# Altium footprint library Dip Switches.PcbLib: 39 footprints (part 1 of 3)
Each footprint in its own frame and in the unit in brackets; x right, y up, seen from the top. Pads: shape width x height; smd on the part's side, far side on the other; paste and mask are expansions set on the pad; w line width, h text height; cw(c..) or ccw(c..) is an arc to the next point about the centre after c.
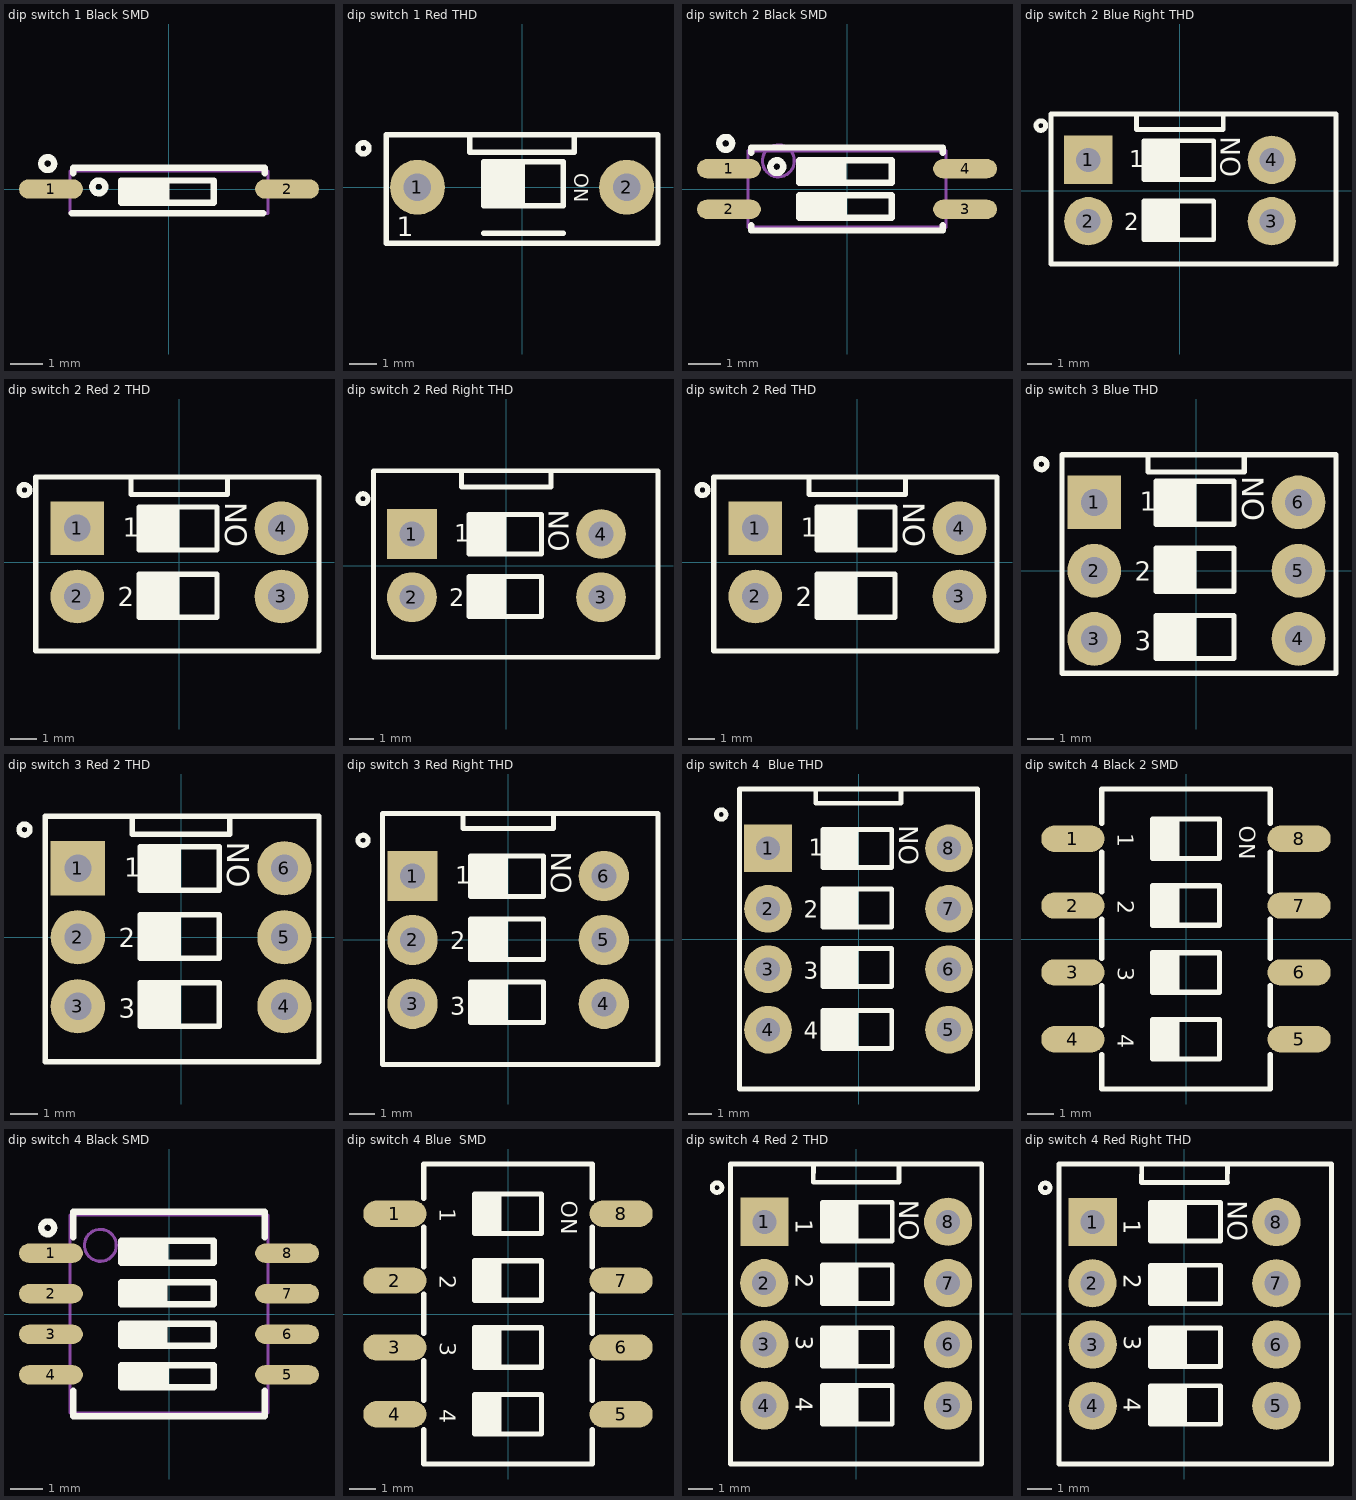
[diagram p0: the footprints below, top view; thin cyan lines are the x and y axes]

## dip switch 1 Black SMD [mm] "SWITCH DIP 12POS, THD, 2.54mm"
pads (2):
  oval 2x0.6 smd: 1(-3.7,0) 2(3.7,0)
Top Overlay:
  circle w0.2: c-3.8,0.795 r0.2
  circle w0.2: c-2.2,0.065 r0.2
  rectangle: -1.482,-0.358 0.018,0.242
  lines w0.2: -3.048,-0.762 2.952,-0.762 ; -3,0.495 -3,0.665 3,0.665 3,0.495 ; -1.5,-0.435 1.4,-0.435 1.4,0.265 -1.5,0.265 -1.5,-0.435
Mechanical 13:
  lines w0.1: -3.1,-0.762 3.1,-0.762 3.1,0.565 -3.1,0.565 -3.1,-0.762
3D body "User Library-SMD DIP Switch 1x.step": height 4.15, standoff 0, extent -4.95,-2.005 4.95,2.005

## dip switch 1 Red THD [mm] "SWITCH DIP 12POS, THD, 2.54mm"
pads (2):
  round 2 hole 1: 1(-3.81,0) 2(3.81,0)
Top Overlay:
  circle w0.2: c-5.776,1.42 r0.2
  rectangle: -1.4,-0.67 0.1,0.93
  lines w0.2: -1.91,1.778 -1.91,1.27 1.9,1.27 1.9,1.905 ; -1.4,-1.67 1.5,-1.67 ; -4.953,-2.032 4.953,-2.032 4.953,1.905 -4.953,1.905 -4.953,-2.032 ; -1.4,-0.67 -1.4,0.93 1.5,0.93 1.5,-0.67 -1.4,-0.67
  text "ON" at 1.905,0.508 h0.51
  text "1" at -4.572,-1.778 h0.7
3D body "User Library-DIP_1 (2).step": height 6.82, standoff -3.65, extent -5,-2.095 5,1.905

## dip switch 2 Black SMD [mm] "SWITCH DIP 2POS, SMD, 1.27mm, 6.1X2.4mm"
height 2.3
pads (4):
  oval 2x0.6 smd: 1(-3.7,0.635) 2(-3.7,-0.635) 3(3.7,-0.635) 4(3.7,0.635)
Top Overlay:
  circle w0.2: c-2.2,0.7 r0.2
  circle w0.2: c-3.8,1.43 r0.2
  rectangle: -1.509,0.238 -0.009,0.838
  rectangle: -1.498,-0.842 0.002,-0.242
  lines w0.2: -3,-1.13 -3,-1.3 3,-1.3 3,-1.13 ; -3,1.13 -3,1.3 3,1.3 3,1.13 ; -1.5,-0.9 1.4,-0.9 1.4,-0.2 -1.5,-0.2 -1.5,-0.9 ; -1.5,0.2 -1.5,0.9 1.4,0.9 1.4,0.2 -1.5,0.2
Mechanical 13:
  circle w0.1: c-2.15,0.88 r0.5
  lines w0.1: -3.1,-1.2 -3.1,1.2 3.1,1.2 3.1,-1.2 -3.1,-1.2
3D body "218-2polesLP.STP": height 2.57, standoff -0.05, extent -4.22,-1.855 4.22,1.855

## dip switch 2 Blue Right THD [mm]
height 6.5
pads (4):
  rect 2x2 hole 1 mask+0.1: 1(-3.8,1.27)
  round 2 hole 1 mask+0.1: 2(-3.8,-1.27) 3(3.8,-1.27) 4(3.8,1.27)
Top Overlay:
  circle w0.2: c-5.766,2.69 r0.2
  rectangle: -1.5,-2.04 0,-0.44
  rectangle: -1.5,0.46 0,2.06
  lines w0.2: -1.8,3.125 -1.8,2.525 1.79,2.525 1.79,3.125 ; -5.345,-3.048 6.464,-3.048 6.464,3.175 -5.345,3.175 -5.345,-3.048 ; -1.5,-2.04 1.4,-2.04 1.4,-0.44 -1.5,-0.44 -1.5,-2.04 ; -1.5,0.46 -1.5,2.06 1.4,2.06 1.4,0.46 -1.5,0.46
  text "2" at -2.3,-1.64 h0.7
  text "1" at -2.1,0.96 h0.7
  text "ON" at 2.5,0.56 h0.8
3D body "User Library-Switch-Piano-DIP-2.step": height 12.46, standoff -3.64, extent -5.244,-3 9.868,3

## dip switch 2 Red 2 THD [mm]
height 6.5
pads (4):
  rect 2x2 hole 1 mask+0.1: 1(-3.8,1.27)
  round 2 hole 1 mask+0.1: 2(-3.8,-1.27) 3(3.8,-1.27) 4(3.8,1.27)
Top Overlay:
  circle w0.2: c-5.766,2.69 r0.2
  rectangle: -1.5,0.46 0,2.06
  rectangle: -1.5,-2.04 0,-0.44
  lines w0.2: -1.8,3.125 -1.8,2.525 1.79,2.525 1.79,3.125 ; -5.345,-3.301 -5.345,3.175 5.196,3.175 5.196,-3.301 -5.345,-3.301 ; -1.5,-2.04 -1.5,-0.44 1.4,-0.44 1.4,-2.04 -1.5,-2.04 ; -1.5,0.46 1.4,0.46 1.4,2.06 -1.5,2.06 -1.5,0.46
  text "ON" at 2.5,0.56 h0.8
  text "1" at -2.1,0.96 h0.7
  text "2" at -2.3,-1.64 h0.7
3D body "User Library-DS1040-02 (DIP_switch).step": height 6.8, standoff -3.85, extent -4.94,-3.34 4.96,3.2

## dip switch 2 Red Right THD [mm]
height 6.5
pads (4):
  rect 2x2 hole 1 mask+0.1: 1(-3.8,1.27)
  round 2 hole 1 mask+0.1: 2(-3.8,-1.27) 3(3.8,-1.27) 4(3.8,1.27)
Top Overlay:
  circle w0.2: c-5.766,2.69 r0.2
  rectangle: -1.5,-2.04 0,-0.44
  rectangle: -1.5,0.46 0,2.06
  lines w0.2: -1.8,3.76 -1.8,3.16 1.79,3.16 1.79,3.76 ; -5.345,-3.681 6.087,-3.681 6.087,3.812 -5.345,3.812 -5.345,-3.681 ; -1.5,-2.04 1.4,-2.04 1.4,-0.44 -1.5,-0.44 -1.5,-2.04 ; -1.5,0.46 -1.5,2.06 1.4,2.06 1.4,0.46 -1.5,0.46
  text "2" at -2.3,-1.64 h0.7
  text "1" at -2.1,0.96 h0.7
  text "ON" at 2.5,0.56 h0.8
3D body "User Library-DIP SW 2P TH RA.step": height 7.9, standoff -3.8, extent -4.961,-3.575 5.959,3.685

## dip switch 2 Red THD [mm]
height 6.5
pads (4):
  rect 2x2 hole 1 mask+0.1: 1(-3.8,1.27)
  round 2 hole 1 mask+0.1: 2(-3.8,-1.27) 3(3.8,-1.27) 4(3.8,1.27)
Top Overlay:
  circle w0.2: c-5.766,2.69 r0.2
  rectangle: -1.5,0.46 0,2.06
  rectangle: -1.5,-2.04 0,-0.44
  lines w0.2: -1.8,3.125 -1.8,2.525 1.79,2.525 1.79,3.125 ; -5.345,-3.301 -5.345,3.175 5.196,3.175 5.196,-3.301 -5.345,-3.301 ; -1.5,-2.04 -1.5,-0.44 1.4,-0.44 1.4,-2.04 -1.5,-2.04 ; -1.5,0.46 1.4,0.46 1.4,2.06 -1.5,2.06 -1.5,0.46
  text "ON" at 2.5,0.56 h0.8
  text "1" at -2.1,0.96 h0.7
  text "2" at -2.3,-1.64 h0.7
3D body "dip2.STEP": height 6.91, standoff -1.79, extent -5.041,-3.249 4.959,3.251

## dip switch 3 Blue THD [mm]
height 6.5
pads (6):
  rect 2x2 hole 1 mask+0.1: 1(-3.8,2.54)
  round 2 hole 1 mask+0.1: 2(-3.8,0) 3(-3.8,-2.54) 4(3.8,-2.54) 5(3.8,0) 6(3.8,2.54)
Top Overlay:
  circle w0.2: c-5.766,3.96 r0.2
  rectangle: -1.5,1.73 0,3.33
  rectangle: -1.5,-0.77 0,0.83
  rectangle: -1.5,-3.27 0,-1.67
  lines w0.2: -1.8,4.268 -1.8,3.668 1.79,3.668 1.79,4.268 ; -5,-3.818 -5,4.31 5.197,4.31 5.197,-3.818 -5,-3.818 ; -1.5,-3.27 -1.5,-1.67 1.4,-1.67 1.4,-3.27 -1.5,-3.27 ; -1.5,-0.77 -1.5,0.83 1.4,0.83 1.4,-0.77 -1.5,-0.77 ; -1.5,1.73 1.4,1.73 1.4,3.33 -1.5,3.33 -1.5,1.73
  text "ON" at 2.5,1.83 h0.8
  text "1" at -2.1,2.23 h0.7
  text "2" at -2.3,-0.37 h0.7
  text "3" at -2.3,-2.97 h0.7
3D body "User Library-switch 3.step": height 7, standoff -3.7, extent -4.957,-3.82 4.943,4.314

## dip switch 3 Red 2 THD [mm]
height 6.5
pads (6):
  rect 2x2 hole 1 mask+0.1: 1(-3.8,2.54)
  round 2 hole 1 mask+0.1: 2(-3.8,0) 3(-3.8,-2.54) 4(3.8,-2.54) 5(3.8,0) 6(3.8,2.54)
Top Overlay:
  circle w0.2: c-5.766,3.96 r0.2
  rectangle: -1.5,1.73 0,3.33
  rectangle: -1.5,-0.77 0,0.83
  rectangle: -1.5,-3.27 0,-1.67
  lines w0.2: -1.8,4.395 -1.8,3.795 1.79,3.795 1.79,4.395 ; -5,-4.573 -5,4.444 5.07,4.444 5.07,-4.573 -5,-4.573 ; -1.5,-3.27 -1.5,-1.67 1.4,-1.67 1.4,-3.27 -1.5,-3.27 ; -1.5,-0.77 -1.5,0.83 1.4,0.83 1.4,-0.77 -1.5,-0.77 ; -1.5,1.73 1.4,1.73 1.4,3.33 -1.5,3.33 -1.5,1.73
  text "ON" at 2.5,1.83 h0.8
  text "1" at -2.1,2.23 h0.7
  text "2" at -2.3,-0.37 h0.7
  text "3" at -2.3,-2.97 h0.7
3D body "User Library-DS1040-03 (DIP_switch).step": height 6.8, standoff -3.85, extent -4.959,-4.541 4.941,4.539

## dip switch 3 Red Right THD [mm]
height 6.5
pads (6):
  rect 2x2 hole 1 mask+0.1: 1(-3.8,2.54)
  round 2 hole 1 mask+0.1: 2(-3.8,0) 3(-3.8,-2.54) 4(3.8,-2.54) 5(3.8,0) 6(3.8,2.54)
Top Overlay:
  circle w0.2: c-5.766,3.96 r0.2
  rectangle: -1.5,-3.27 0,-1.67
  rectangle: -1.5,-0.77 0,0.83
  rectangle: -1.5,1.73 0,3.33
  lines w0.2: -1.8,5.03 -1.8,4.43 1.79,4.43 1.79,5.03 ; -5,-4.953 5.949,-4.953 5.949,5.03 -5,5.03 -5,-4.953 ; -1.5,-3.27 1.4,-3.27 1.4,-1.67 -1.5,-1.67 -1.5,-3.27 ; -1.5,-0.77 1.4,-0.77 1.4,0.83 -1.5,0.83 -1.5,-0.77 ; -1.5,1.73 -1.5,3.33 1.4,3.33 1.4,1.73 -1.5,1.73
  text "3" at -2.3,-2.97 h0.7
  text "2" at -2.3,-0.37 h0.7
  text "1" at -2.1,2.23 h0.7
  text "ON" at 2.5,1.83 h0.8
3D body "User Library-DIP SW 3P TH RA (1).step": height 7.9, standoff -3.8, extent -4.91,-4.901 6.011,4.899

## dip switch 4  Blue THD [mm] "SWITCH DIP 4POS, THD, 2.54mm, YL04"
height 6.5
pads (8):
  rect 2x2 hole 1 mask+0.1: 1(-3.8,3.81)
  round 2 hole 1 mask+0.1: 2(-3.8,1.27) 3(-3.8,-1.27) 4(-3.8,-3.81) 5(3.8,-3.81) 6(3.8,-1.27) 7(3.8,1.27) 8(3.8,3.81)
Top Overlay:
  circle w0.2: c-5.766,5.23 r0.2
  rectangle: -1.5,3 0,4.6
  rectangle: -1.5,0.5 0,2.1
  rectangle: -1.5,-2 0,-0.4
  rectangle: -1.5,-4.6 0,-3
  lines w0.2: -1.8,6.3 -1.8,5.7 1.79,5.7 1.79,6.3 ; -5,-6.3 -5,6.3 5,6.3 5,-6.3 -5,-6.3 ; -1.5,-4.6 -1.5,-3 1.4,-3 1.4,-4.6 -1.5,-4.6 ; -1.5,-2 -1.5,-0.4 1.4,-0.4 1.4,-2 -1.5,-2 ; -1.5,0.5 -1.5,2.1 1.4,2.1 1.4,0.5 -1.5,0.5 ; -1.5,3 1.4,3 1.4,4.6 -1.5,4.6 -1.5,3
  text "ON" at 2.5,3.1 h0.8
  text "1" at -2.1,3.5 h0.7
  text "2" at -2.3,0.9 h0.7
  text "3" at -2.3,-1.7 h0.7
  text "4" at -2.3,-4.2 h0.7
3D body "User Library-DIP SWITCH 4 POS CTS 206.step": height 8.14, standoff -3.5, extent -4.89,-6.17 4.89,6.17

## dip switch 4 Black 2 SMD [mm] "SWITCH DIP 4POS, SMD, 2.54mm, CTS-219-04"
pads (8):
  oval 2.4x1 smd: 1(-4.3,3.81) 2(-4.3,1.27) 3(-4.3,-1.27) 4(-4.3,-3.81) 5(4.3,-3.81) 6(4.3,-1.27) 7(4.3,1.27) 8(4.3,3.81)
Top Overlay:
  region: -1.27,4.56 -1.27,3.06 -0.254,3.06 -0.254,4.56
  region: -1.27,2.02 -1.27,0.52 -0.254,0.52 -0.254,2.02
  region: -1.27,-0.52 -1.27,-2.02 -0.254,-2.02 -0.254,-0.52
  region: -1.27,-3.06 -1.27,-4.56 -0.254,-4.56 -0.254,-3.06
  lines w0.2: -3.2,-4.4 -3.2,-5.7 3.2,-5.7 3.2,-4.4 ; -3.2,-3.28 -3.2,-1.78 ; -3.2,-0.74 -3.2,0.76 ; -3.2,1.8 -3.2,3.3 ; -3.2,4.4 -3.2,5.7 3.2,5.7 3.2,4.4 ; 3.2,-3.28 3.2,-1.78 ; 3.2,-0.74 3.2,0.76 ; 3.2,1.8 3.2,3.3 ; -1.27,-4.56 -1.27,-3.06 1.27,-3.06 1.27,-4.56 -1.27,-4.56 ; -1.27,-2.02 -1.27,-0.52 1.27,-0.52 1.27,-2.02 -1.27,-2.02 ; -1.27,0.52 -1.27,2.02 1.27,2.02 1.27,0.52 -1.27,0.52 ; -1.27,3.06 -1.27,4.56 1.27,4.56 1.27,3.06 -1.27,3.06
  text "ON" at 2.021,4.31 h0.61
  text "1" at -2.596,4.01 h0.61
  text "2" at -2.596,1.47 h0.61
  text "3" at -2.596,-1.07 h0.61
  text "4" at -2.596,-3.61 h0.61
3D body "User Library-DM04V.step": height 4.52, standoff 0, extent -4.89,-5.55 4.89,5.55

## dip switch 4 Black SMD [mm] "SWITCH DIP 4POS, SMD, 1.27mm, 6.1X6.2mm , TDA series"
height 2.3
pads (8):
  oval 2x0.6 smd: 1(-3.7,1.905) 2(-3.7,0.635) 3(-3.7,-0.635) 4(-3.7,-1.905) 5(3.7,-1.905) 6(3.7,-0.635) 7(3.7,0.635) 8(3.7,1.905)
Top Overlay:
  circle w0.2: c-3.8,2.7 r0.2
  rectangle: -1.504,-2.246 -0.004,-1.646
  rectangle: -1.544,-0.943 -0.044,-0.343
  rectangle: -1.544,0.368 -0.044,0.968
  rectangle: -1.517,1.621 -0.017,2.221
  lines w0.2: -3,-2.4 -3,-3.2 3,-3.2 3,-2.4 ; -3,2.4 -3,3.2 3,3.2 3,2.4 ; -1.5,-2.3 -1.5,-1.6 1.4,-1.6 1.4,-2.3 -1.5,-2.3 ; -1.5,-1 -1.5,-0.3 1.4,-0.3 1.4,-1 -1.5,-1 ; -1.5,0.3 -1.5,1 1.4,1 1.4,0.3 -1.5,0.3 ; -1.5,1.6 -1.5,2.3 1.4,2.3 1.4,1.6 -1.5,1.6
Mechanical 13:
  circle w0.1: c-2.15,2.15 r0.5
  lines w0.1: -3.1,-3.1 -3.1,3.1 3.1,3.1 3.1,-3.1 -3.1,-3.1
3D body "218-4polesLP.STP": height 2.57, standoff -0.05, extent -4.22,-3.125 4.22,3.125

## dip switch 4 Blue  SMD [mm] "SWITCH DIP 4POS, SMD, 2.54mm, CTS-219-04"
pads (8):
  oval 2.4x1 smd: 1(-4.3,3.81) 2(-4.3,1.27) 3(-4.3,-1.27) 4(-4.3,-3.81) 5(4.3,-3.81) 6(4.3,-1.27) 7(4.3,1.27) 8(4.3,3.81)
Top Overlay:
  region: -1.27,-3.06 -1.27,-4.56 -0.254,-4.56 -0.254,-3.06
  region: -1.27,-0.52 -1.27,-2.02 -0.254,-2.02 -0.254,-0.52
  region: -1.27,2.02 -1.27,0.52 -0.254,0.52 -0.254,2.02
  region: -1.27,4.56 -1.27,3.06 -0.254,3.06 -0.254,4.56
  lines w0.2: -3.2,-4.4 -3.2,-5.7 3.2,-5.7 3.2,-4.4 ; -3.2,-3.28 -3.2,-1.78 ; -3.2,-0.74 -3.2,0.76 ; -3.2,1.8 -3.2,3.3 ; -3.2,4.4 -3.2,5.7 3.2,5.7 3.2,4.4 ; 3.2,-3.28 3.2,-1.78 ; 3.2,-0.74 3.2,0.76 ; 3.2,1.8 3.2,3.3 ; -1.27,-4.56 1.27,-4.56 1.27,-3.06 -1.27,-3.06 -1.27,-4.56 ; -1.27,-2.02 1.27,-2.02 1.27,-0.52 -1.27,-0.52 -1.27,-2.02 ; -1.27,0.52 1.27,0.52 1.27,2.02 -1.27,2.02 -1.27,0.52 ; -1.27,3.06 1.27,3.06 1.27,4.56 -1.27,4.56 -1.27,3.06
  text "4" at -2.596,-3.61 h0.61
  text "3" at -2.596,-1.07 h0.61
  text "2" at -2.596,1.47 h0.61
  text "1" at -2.596,4.01 h0.61
  text "ON" at 2.021,4.31 h0.61
3D body "User Library-CTS 219-4MST DIP switch bank x1.step": height 4.27, standoff 0, extent -4.955,-5.788 4.955,5.842

## dip switch 4 Red 2 THD [mm]
height 6.5
pads (8):
  rect 2x2 hole 1: 1(-3.805,3.81)
  round 2 hole 1: 2(-3.815,1.27) 3(-3.805,-1.27) 4(-3.805,-3.81) 5(3.815,-3.81) 6(3.815,-1.27) 7(3.815,1.27) 8(3.815,3.81)
Top Overlay:
  circle w0.2: c-5.771,5.23 r0.2
  rectangle: -1.4,-4.58 0.1,-2.98
  rectangle: -1.4,-2.18 0.1,-0.58
  rectangle: -1.4,0.42 0.1,2.02
  rectangle: -1.4,3.02 0.1,4.62
  lines w0.2: -1.782,5.45 -1.773,6.164 ; -1.773,5.45 1.783,5.45 ; 1.774,5.45 1.783,6.164 ; -5.207,-6.236 5.212,-6.236 5.212,6.21 -5.207,6.21 -5.207,-6.236 ; -1.4,-4.58 1.5,-4.58 1.5,-2.98 -1.4,-2.98 -1.4,-4.58 ; -1.4,-2.18 1.5,-2.18 1.5,-0.58 -1.4,-0.58 -1.4,-2.18 ; -1.4,0.42 1.5,0.42 1.5,2.02 -1.4,2.02 -1.4,0.42 ; -1.4,3.02 1.5,3.02 1.5,4.62 -1.4,4.62 -1.4,3.02
  text "4" at -2.51,-3.474 h0.7
  text "3" at -2.51,-0.913 h0.7
  text "2" at -2.51,1.647 h0.7
  text "ON" at 2.6,3.02 h0.8
  text "1" at -2.51,3.911 h0.7
3D body "User Library-DIP SW 4P TH.step": height 3.8, standoff -8.5, extent -4.89,-6.21 4.89,6.21

## dip switch 4 Red Right THD [mm]
height 6.5
pads (8):
  rect 2x2 hole 1: 1(-3.805,3.81)
  round 2 hole 1: 2(-3.815,1.27) 3(-3.805,-1.27) 4(-3.805,-3.81) 5(3.815,-3.81) 6(3.815,-1.27) 7(3.815,1.27) 8(3.815,3.81)
Top Overlay:
  circle w0.2: c-5.771,5.23 r0.2
  rectangle: -1.4,3.02 0.1,4.62
  rectangle: -1.4,0.42 0.1,2.02
  rectangle: -1.4,-2.18 0.1,-0.58
  rectangle: -1.4,-4.58 0.1,-2.98
  lines w0.2: -1.782,5.45 -1.773,6.164 ; -1.773,5.45 1.783,5.45 ; 1.774,5.45 1.783,6.164 ; -5.207,-6.227 6.104,-6.227 6.105,6.219 -5.207,6.219 -5.207,-6.227 ; -1.4,-4.58 -1.4,-2.98 1.5,-2.98 1.5,-4.58 -1.4,-4.58 ; -1.4,-2.18 -1.4,-0.58 1.5,-0.58 1.5,-2.18 -1.4,-2.18 ; -1.4,0.42 -1.4,2.02 1.5,2.02 1.5,0.42 -1.4,0.42 ; -1.4,3.02 -1.4,4.62 1.5,4.62 1.5,3.02 -1.4,3.02
  text "ON" at 2.6,3.02 h0.8
  text "1" at -2.51,3.911 h0.7
  text "2" at -2.51,1.647 h0.7
  text "3" at -2.51,-0.913 h0.7
  text "4" at -2.51,-3.474 h0.7
3D body "User Library-DIP SW 4P TH RA.step": height 7.9, standoff -3.8, extent -4.881,-6.174 6.039,6.166